# Altium footprint library 1MaxPcb.PcbLib: 187 footprints (part 6 of 12)
Each footprint in its own frame and in the unit in brackets; x right, y up, seen from the top. Pads: shape width x height; smd on the part's side, far side on the other; paste and mask are expansions set on the pad; w line width, h text height; cw(c..) or ccw(c..) is an arc to the next point about the centre after c.
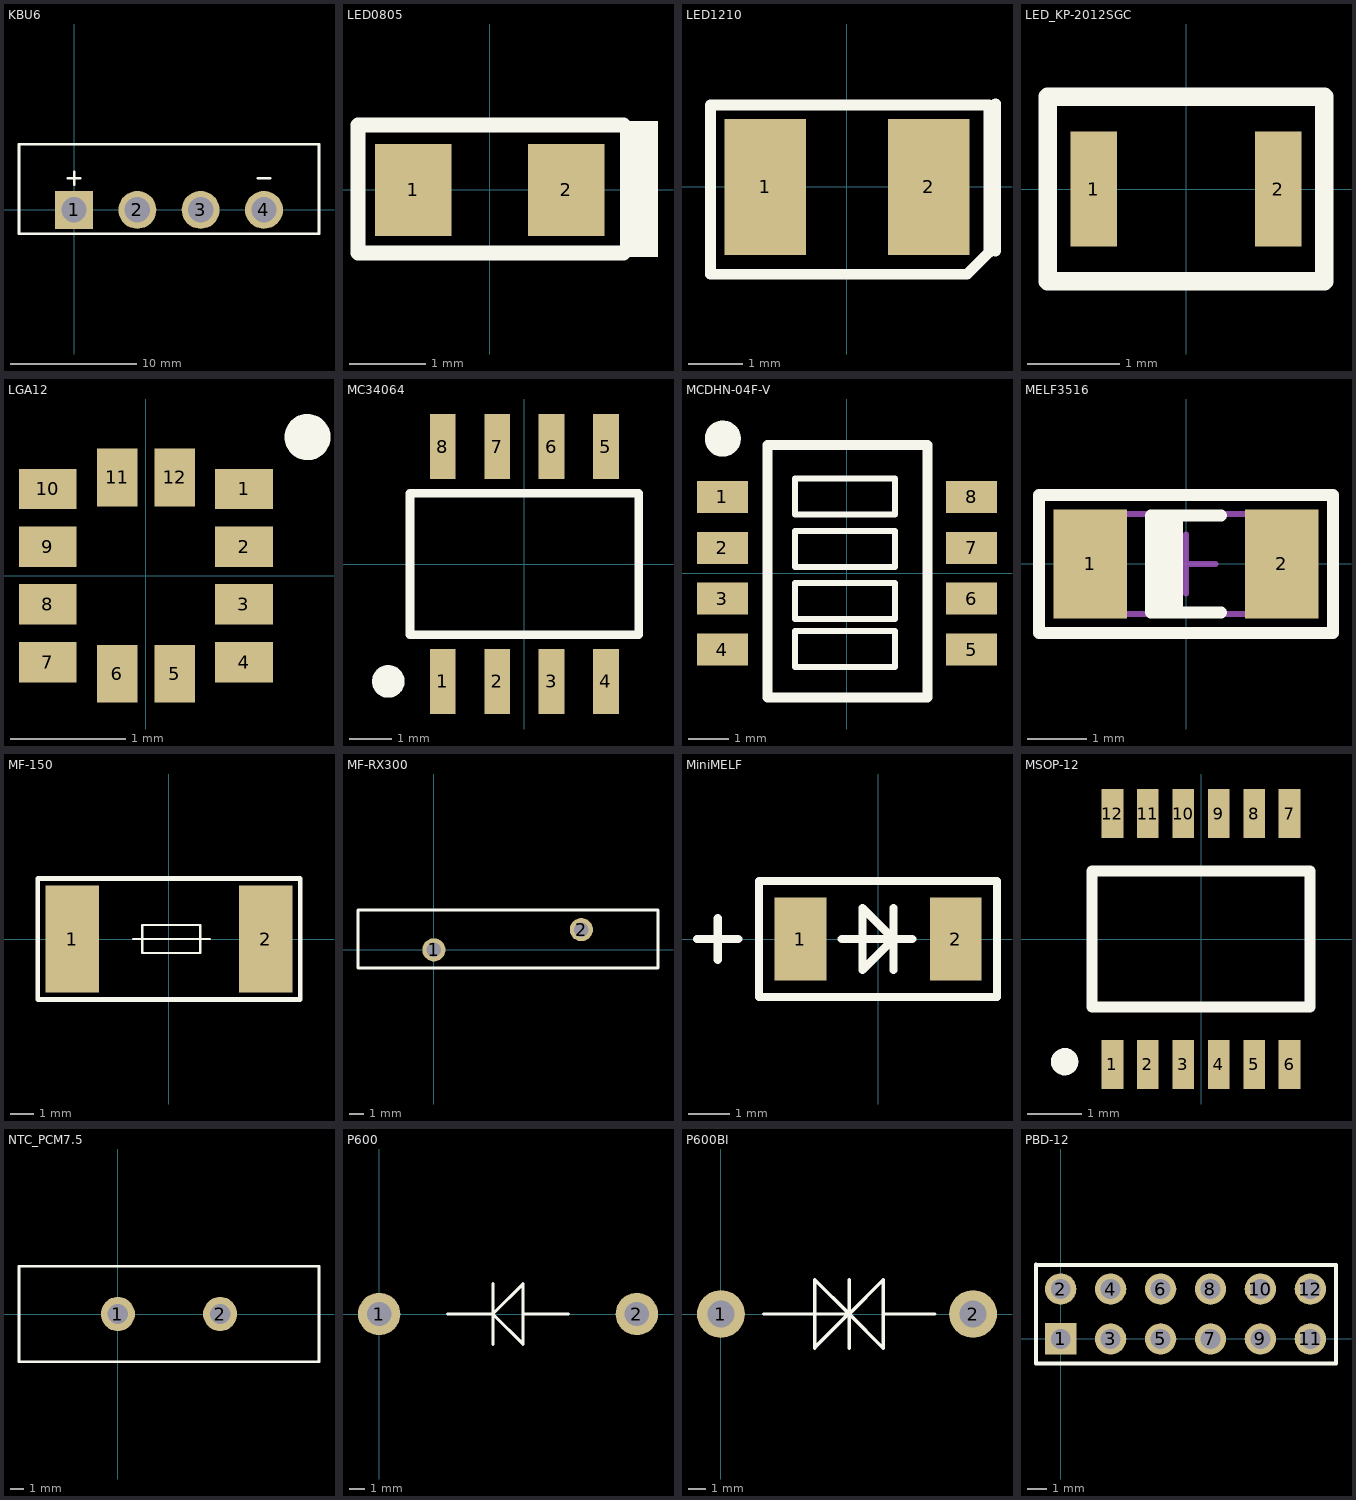
[diagram p5: the footprints below, top view; thin cyan lines are the x and y axes]

## KBU6 [mm]
pads (4):
  rect 3x3 hole 2: 1(0,0)
  round 3 hole 2: 2(5,0) 3(10,0) 4(15,0)
Top Overlay:
  lines w0.2: -0.5,2.5 0.5,2.5 ; 0,2 0,3 ; 14.5,2.5 15.5,2.5 ; -4.35,-1.9 19.35,-1.9 19.35,5.2 -4.35,5.2 -4.35,-1.9

## LED0805 [mm]
height 0.5
pads (2):
  rect 1x1.2 smd mask+0.03: 1(-1,0) 2(1,0)
Top Overlay:
  rectangle: 1.7,-0.875 2.2,0.9
  lines w0.1: 1.75,-0.825 1.75,0.85
  lines w0.2: 1.75,-0.825 -1.725,-0.825 -1.725,0.85 1.75,0.85
3D body "LED-0805green.step": height 1.1, standoff 0, extent -0.91,-0.625 1.11,0.625

## LED1210 [mm]
pads (2):
  rect 1.5x2.5 smd mask+0.05: 1(-1.5,0) 2(1.5,0)
Top Overlay:
  lines w0.2: 2.725,-1.175 2.725,1.525 ; -2.5,-1.6 2.2,-1.6 2.6,-1.2 2.6,1.5 -2.5,1.5 -2.5,-1.6
3D body "User Library-Everlight 67-21SRC-TR8.STEP": height 1.86, standoff 0, extent -1.75,-1.4 1.75,1.4

## LED_KP-2012SGC [mm]
pads (2):
  rect 0.5x1.25 smd paste+0 mask+0.1: 1(-1,0) 2(1,0)
Top Overlay:
  lines w0.2: -1.5,-1 1.5,-1 1.5,1 -1.5,1 -1.5,-1
3D body "LED-0805green.step": height 1.1, standoff 0, extent -1.01,-0.625 1.01,0.625

## LGA12 [mm]
height 0.6
pads (12):
  rect 0.5x0.35 smd mask+0.05: 1(0.85,0.75) 2(0.85,0.25) 3(0.85,-0.25) 4(0.85,-0.75) 7(-0.85,-0.75) 8(-0.85,-0.25) 9(-0.85,0.25) 10(-0.85,0.75)
  rect 0.35x0.5 smd mask+0.05: 5(0.25,-0.85) 6(-0.25,-0.85) 11(-0.25,0.85) 12(0.25,0.85)
Top Overlay:
  circle w0.2: c1.4,1.2 r0.1
3D body "User Library-lga-2x2x0_9.step": height 0.94, standoff -0.01, extent -1,-1 1,1

## MC34064 [mm] "Undervoltage Sensing Circuit SOIC-8"
pads (8):
  rect 0.6x1.52 smd: 1(-1.905,-2.74) 2(-0.635,-2.74) 3(0.635,-2.74) 4(1.905,-2.74) 5(1.905,2.74) 6(0.635,2.74) 7(-0.635,2.74) 8(-1.905,2.74)
Top Overlay:
  circle w0.254: c-3.175,-2.74 r0.254
  region: -3.175,-2.994 -3.226,-2.994 -3.319,-2.955 -3.39,-2.884 -3.429,-2.791 -3.429,-2.74 -3.429,-2.689 -3.39,-2.596 -3.319,-2.525 -3.226,-2.486 -3.175,-2.486 -3.124,-2.486 -3.031,-2.525 -2.96,-2.596 -2.921,-2.689 -2.921,-2.74 -2.921,-2.791 -2.96,-2.884 -3.031,-2.955 -3.124,-2.994
  lines w0.2: -2.667,-1.648 -2.667,1.654 2.667,1.654 2.667,-1.648 -2.667,-1.648
3D body "User Library-SOIC-8-1.STEP": height 1.75, standoff 0, extent -2.45,-3.047 2.45,2.953

## MCDHN-04F-V [mm]
height 1.5
pads (8):
  rect 1.27x0.8 smd: 1(-3.11,1.905) 2(-3.11,0.635) 3(-3.11,-0.635) 4(-3.11,-1.905) 5(3.11,-1.905) 6(3.11,-0.635) 7(3.11,0.635) 8(3.11,1.905)
Top Overlay:
  circle w0.5: c-3.1,3.36 r0.2
  lines w0.15: -1.3,-2.34 1.2,-2.34 1.2,-1.44 -1.3,-1.44 -1.3,-2.34 ; -1.3,-1.14 1.2,-1.14 1.2,-0.24 -1.3,-0.24 -1.3,-1.14 ; -1.3,0.16 1.2,0.16 1.2,1.06 -1.3,1.06 -1.3,0.16 ; -1.3,1.46 -1.3,2.36 1.2,2.36 1.2,1.46 -1.3,1.46
  lines w0.25: -1.99,-3.1 2.01,-3.1 2.01,3.2 -1.99,3.2 -1.99,-3.1
3D body "User Library-MCDHN-04.STEP": height 1.57, standoff -0.03, extent -3.35,-3.11 3.35,3.2

## MELF3516 [mm] "MELF Diode, 2-Leads, Body 3,50x1,65mm, IPC Medium Density"
height 1.7
pads (2):
  rect 1.25x1.85 smd: 1(-1.625,0) 2(1.625,0)
Top Overlay:
  rectangle: -0.6,-0.825 -0.05,0.825
  lines w0.2: 0.6,-0.825 -0.6,-0.825 -0.6,0.825 0.6,0.825 ; -2.5,-1.175 -2.5,1.175 2.5,1.175 2.5,-1.175 -2.5,-1.175
Mechanical 13:
  lines w0.1: -1.85,-0.85 -1.85,0.85 1.85,0.85 1.85,-0.85 -1.85,-0.85
Mechanical 15:
  lines w0.1: -0.5,0 0.5,0 ; 0,-0.5 0,0.5
3D body: height 1.69, standoff 0, extent -1.85,-0.85 -1.3,0.847
3D body: height 1.68, standoff 0.04, extent -0.7,-0.821 -0.1,0.818
3D body: height 1.68, standoff 0.04, extent -1.3,-0.82 1.3,0.817
3D body: height 1.69, standoff 0, extent 1.3,-0.85 1.85,0.847

## MF-150 [mm]
height 3.18
pads (2):
  rect 2.3x4.6 smd mask+0.03: 1(-4.15,0) 2(4.15,0)
Top Overlay:
  lines w0.1: -1.55,0 1.75,0 ; -1.15,-0.6 1.35,-0.6 1.35,0 1.35,0.6 -1.15,0.6 -1.15,-0.6
  lines w0.2: -5.65,-2.6 -5.65,2.6 5.65,2.6 5.65,-2.6 -5.65,-2.6
3D body "MF-SM075.step": height 4, standoff 0, extent -3.7,-2.5 3.8,2.5

## MF-RX300 [mm]
pads (2):
  round 1.6 hole 1: 1(0,0) 2(10.2,1.4)
Top Overlay:
  lines w0.2: -5.25,-1.25 15.5,-1.25 15.5,2.75 9,2.75 -5.25,2.75 -5.25,-1.25
3D body "pts(300-72(прям)).stp": height 26.33, standoff -7.89, extent -5.235,-0.833 15.435,2.234

## MiniMELF [mm] "MiniMELF_LL4148"
pads (2):
  rect 1.25x2 smd: 1(-1.875,0) 2(1.875,0)
Top Overlay:
  lines w0.2: -4.375,0 -3.375,0 ; -3.875,-0.5 -3.875,0.5 ; -0.875,0 0.825,0 ; 0.375,-0.75 0.375,0.75 ; -2.875,-1.4 -2.875,1.4 2.875,1.4 2.875,-1.4 -2.875,-1.4 ; -0.375,-0.75 -0.375,0.75 0.375,0 -0.375,-0.75
3D body "SOD-80 MiniMELF.stp": height 1.58, standoff -0.02, extent -2,-0.8 1.7,0.8

## MSOP-12 [mm]
pads (12):
  rect 0.4x0.9 smd mask+0.05: 1(-1.625,-2.3) 2(-0.975,-2.3) 3(-0.325,-2.3) 4(0.325,-2.3) 5(0.975,-2.3) 6(1.625,-2.3) 7(1.625,2.3) 8(0.975,2.3) 9(0.325,2.3) 10(-0.325,2.3) 11(-0.975,2.3) 12(-1.625,2.3)
Top Overlay:
  circle w0.25: c-2.5,-2.25 r0.125
  lines w0.2: -2,-1.25 2,-1.25 2,1.25 -2,1.25 -2,-1.25
3D body "MSOP-12.step": height 1.1, standoff 0, extent -2.02,-2.45 2.02,2.45

## NTC_PCM7.5 [mm]
pads (2):
  round 2.5 hole 1.5: 1(0,0) 2(7.5,0)
Top Overlay:
  lines w0.2: -7.25,-3.5 -7.25,3.5 14.75,3.5 14.75,-3.5 -7.25,-3.5
3D body "ntc_b57364s.stp": height 25.5, standoff -1.5, extent -7,-3.5 14,3.5

## P600 [mm] "TVS_DIODE_P600B"
pads (2):
  round 2.8 hole 1.6: 1(0,0) 2(17,0)
Top Overlay:
  lines w0.2: 4.5,0 7.5,0 ; 7.5,-2 7.5,2 ; 9.5,0 12.5,0 ; 7.5,0 7.5,0 ; 7.5,0 9.5,-2 9.5,2 7.5,0
3D body "P600.STEP": height 10.13, standoff -4.11, extent -1.41,-4.5 18.41,4.6

## P600BI [mm] "TVS_DIODE_P600B"
pads (2):
  round 2.8 hole 1.6: 1(0,0) 2(14.75,0)
Top Overlay:
  lines w0.2: 2.5,0 7.5,0 ; 5.5,-2 5.5,2 7.5,0 ; 5.55,-1.9 7.55,0.1 ; 7.5,-2 7.5,2 ; 9.5,0 12.5,0 ; 7.5,0 9.5,-2 9.5,2 7.5,0
3D body "P600_BI.STEP": height 11.55, standoff -1.5, extent -1,-4.6 15.58,4.5

## PBD-12 [mm]
pads (12):
  rect 1.6x1.6 hole 1: 1(0,0)
  round 1.6 hole 1: 2(0,2.54) 3(2.54,0) 4(2.54,2.54) 5(5.08,0) 6(5.08,2.54) 7(7.62,0) 8(7.62,2.54) 9(10.16,0) 10(10.16,2.54) 11(12.7,0) 12(12.7,2.54)
Top Overlay:
  lines w0.2: -1.25,3.75 14,3.75 14,-1.25 13.25,-1.25 -1.25,-1.25 -1.25,2.5 -1.25,3.79
3D body "User Library-PBD2_54-10.step": height 8.4, standoff -2.7, extent -1.27,-1.27 11.43,3.81
3D body "User Library-PBD2_54-10.step": height 8.4, standoff -2.7, extent 1.27,-1.27 13.97,3.81